# Altium footprint library Conectores GAM.PcbLib: 182 footprints (part 11 of 12)
Each footprint in its own frame and in the unit in brackets; x right, y up, seen from the top. Pads: shape width x height; smd on the part's side, far side on the other; paste and mask are expansions set on the pad; w line width, h text height; cw(c..) or ccw(c..) is an arc to the next point about the centre after c.
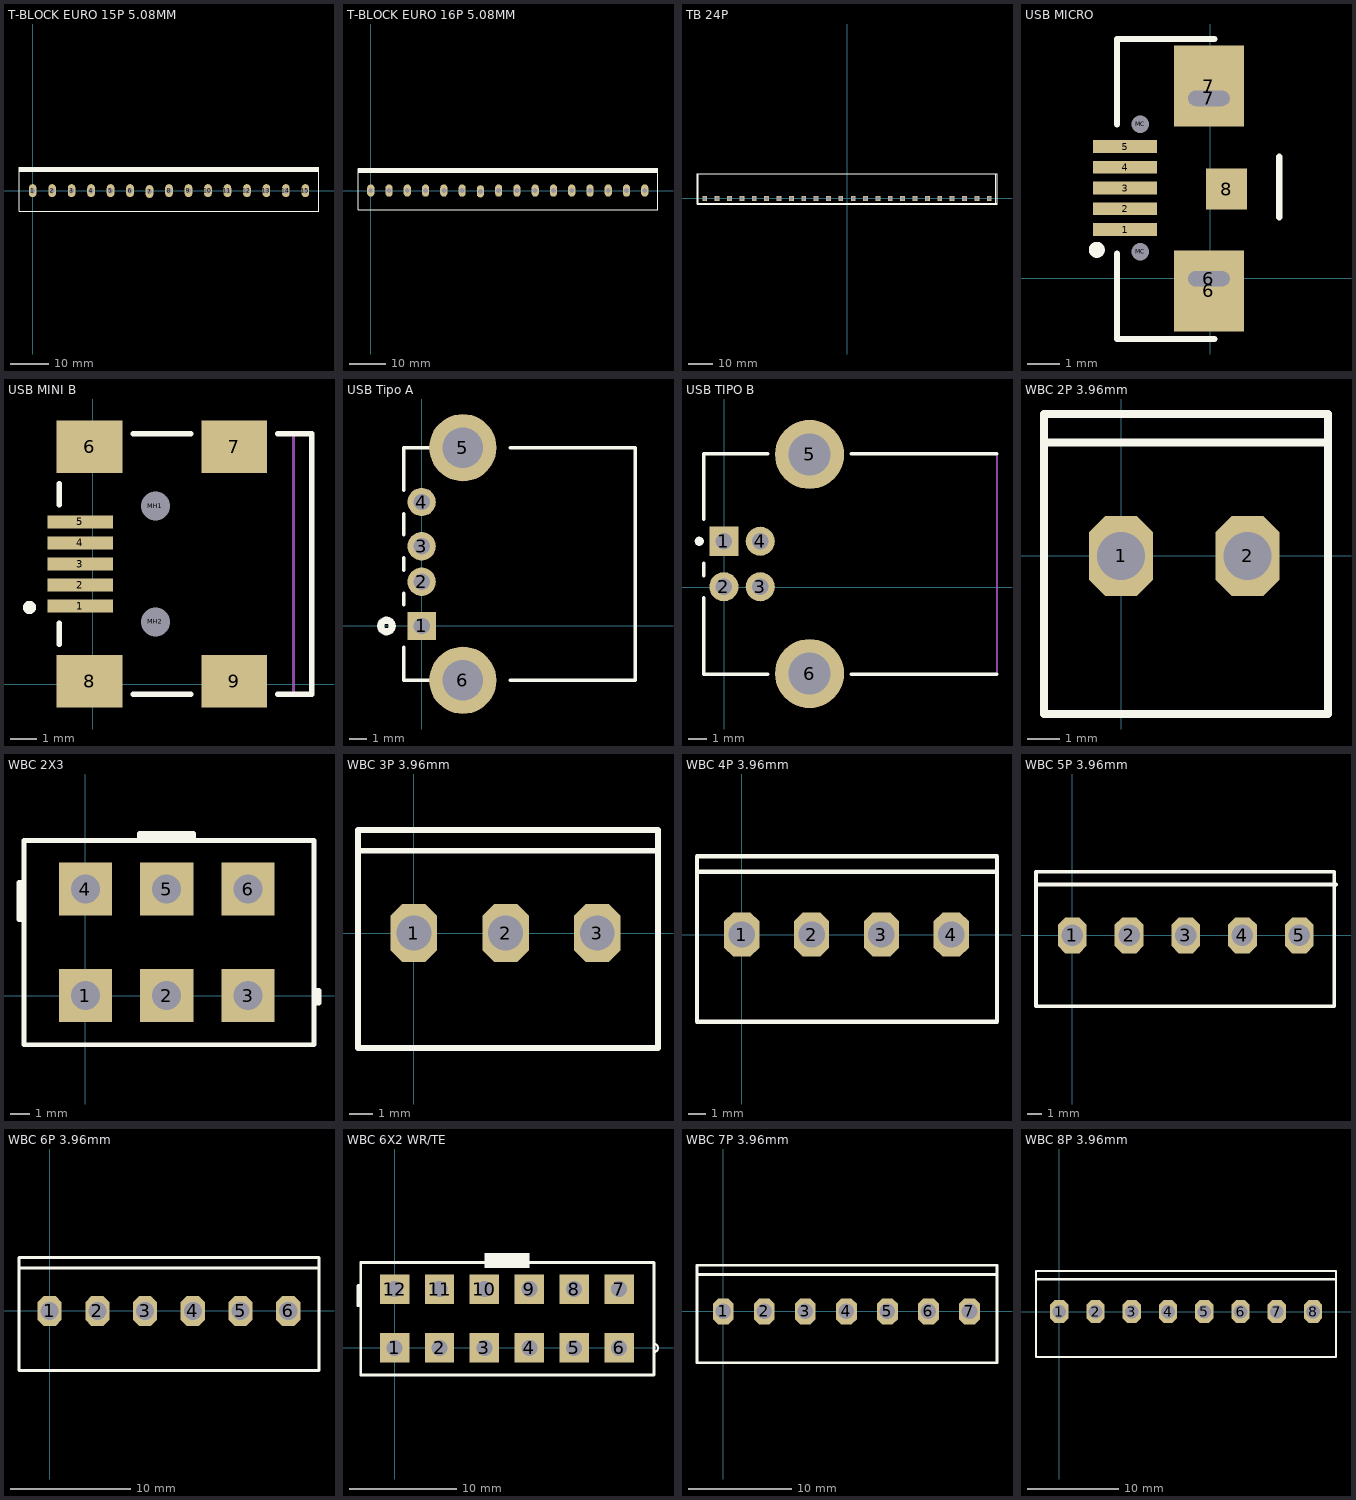
[diagram p10: the footprints below, top view; thin cyan lines are the x and y axes]

## T-BLOCK EURO 15P 5.08MM [mm] "Terminal de Bloque 15P 5.08mm EURO STYLE"
pads (15):
  oval 2x3.4 hole 1.35: 1(0,0) 2(5.08,0) 3(10.16,0) 4(15.24,0) 5(20.32,0) 6(25.4,0) 7(30.48,-0.208) 8(35.56,0) 9(40.64,0) 10(45.72,0) 11(50.8,0) 12(55.88,0) 13(60.96,0) 14(66.04,0) 15(71.12,0)
Top Overlay:
  rectangle: -3.556,4.826 74.676,6.223
  lines w0.254: -3.429,-5.334 74.549,-5.334 74.549,6.096 -3.429,6.096 -3.429,-5.334
3D body "CUI_DEVICES_TB009-508-15BE.step": height 20, standoff -3.5, extent -3.175,-5.08 74.225,5.42

## T-BLOCK EURO 16P 5.08MM [mm] "Terminal de Bloque 16P 5.08mm EURO STYLE"
pads (16):
  oval 2x3.4 hole 1.35: 1(0,0) 2(5.08,0) 3(10.16,0) 4(15.24,0) 5(20.32,0) 6(25.4,0) 7(30.48,-0.208) 8(35.56,0) 9(40.64,0) 10(45.72,0) 11(50.8,0) 12(55.88,0) 13(60.96,0) 14(66.04,0) 15(71.12,0) 16(76.2,0)
Top Overlay:
  rectangle: -3.556,4.826 79.883,6.223
  lines w0.254: -3.429,-5.334 79.756,-5.334 79.756,6.096 -3.429,6.096 -3.429,-5.334
3D body "CUI_DEVICES_TB009-508-16BE.step": height 20, standoff -3.5, extent -3.175,-5.08 79.305,5.42

## TB 24P [mm] "Desmontable Terminal Block 24P 5.08mm"
pads (24):
  rect 2x2 hole 1.5: 1(58.42,0) 2(53.34,0) 3(48.26,0) 4(43.18,0) 5(38.1,0) 6(33.02,0) 7(27.94,0) 8(22.86,0) 9(17.78,0) 10(12.7,0) 11(7.62,0) 12(2.54,0) 13(-2.54,0) 14(-7.62,0) 15(-12.7,0) 16(-17.78,0) 17(-22.86,0) 18(-27.94,0) 19(-33.02,0) 20(-38.1,0) 21(-43.18,0) 22(-48.26,0) 23(-53.34,0) 24(-58.42,0)
Top Overlay:
  lines w0.2: -61.595,-2.032 61.595,-2.032 ; -61.087,-2.413 -61.087,10.16 ; 61.087,-2.413 61.087,10.16 ; -61.595,-2.413 61.595,-2.413 61.595,10.16 -61.595,10.16 -61.595,-2.413
3D body "24PTB.stp": height 8.6, standoff -3.5, extent -60.96,-2.064 60.96,9.938

## USB MICRO [mm]
pads (12):
  rect 2x0.4 smd: 1(-2.667,1.524) 2(-2.667,2.174) 3(-2.667,2.824) 4(-2.667,3.474) 5(-2.667,4.124)
  rect 2.2x2.54 smd: 6(-0.043,-0.397) 7(-0.043,6.015)
  oval 2.15x1.1 hole 0.48 slot 1.3 at 0 deg unplated: 6(-0.043,-0.016) 7(-0.043,5.634)
  rect 1.27x1.27 smd: 8(0.508,2.794)
  round 0.3 hole 0.55 unplated: MC(-2.193,0.824) MC(-2.193,4.824)
Top Overlay:
  circle w0.25: c-3.556,0.889 r0.125
  lines w0.2: -2.921,0.762 -2.921,-1.905 0.127,-1.905 ; -2.921,4.826 -2.921,7.493 0.127,7.493 ; 2.159,1.905 2.159,3.81
3D body "Micro USB.step": height 2.65, standoff -0.69, extent -2.794,-1.068 2.696,6.715

## USB MINI B [mm]
pads (11):
  rect 2.5x0.5 smd: 1(-0.484,2.972) 2(-0.484,3.772) 3(-0.484,4.572) 4(-0.484,5.372) 5(-0.484,6.172)
  rect 2.5x2 smd: 6(-0.13,9.022) 7(5.37,9.022) 8(-0.13,0.122) 9(5.37,0.122)
  round 0.6 hole 1.1 unplated: MH1(2.37,6.772) MH2(2.37,2.372)
Top Overlay:
  circle w0.25: c-2.413,2.921 r0.125
  lines w0.2: -1.28,1.522 -1.28,2.322 ; -1.28,6.822 -1.28,7.622 ; 1.52,-0.378 3.72,-0.378 ; 1.52,9.522 3.72,9.522 ; 7.02,-0.378 8.32,-0.378 8.32,9.522 7.02,9.522
Mechanical 1:
  lines w0.1: 7.62,-0.378 7.62,9.522
  text "PCB Edge" at 8.052,0.536 h0.25
3D body "Mini USB.stp": height 4.03, standoff -0.9, extent -1.016,-0.505 8.234,9.395

## USB Tipo A [mm]
pads (6):
  rect 1.6x1.6 hole 0.92: 1(0,0)
  round 1.6 hole 0.92: 2(0,2.5) 3(0,4.5) 4(0,7)
  round 3.8 hole 2.3: 5(2.329,10.07) 6(2.329,-3.07)
Top Overlay:
  circle w0.4: c-1.985,0 r0.327
  lines w0.2: -1.01,-1.2 -1.01,-3.065 0.41,-3.065 ; -1.01,1.2 -1.01,1.84 ; -1.01,3.16 -1.01,3.84 ; -1.01,5.16 -1.01,6.34 ; -1.01,7.66 -1.01,10.065 0.41,10.065 ; 5.01,-3.065 12.065,-3.065 12.065,10.065 5.01,10.065
3D body "USB-A-01.step": height 7.95, standoff -3.2, extent -1.218,-4.527 12.482,11.273

## USB TIPO B [mm]
pads (6):
  rect 1.6x1.6 hole 0.92: 1(-0.024,2.52)
  round 1.6 hole 0.92: 2(-0.024,0.02) 3(1.976,0.02) 4(1.976,2.52)
  round 3.8 hole 2.3: 5(4.686,7.29) 6(4.686,-4.75)
Top Overlay:
  circle w0.25: c-1.374,2.52 r0.125
  lines w0.2: -1.134,-0.58 -1.134,-4.78 2.386,-4.78 ; -1.134,0.62 -1.134,1.32 ; -1.134,3.72 -1.134,7.32 2.386,7.32 ; 6.986,-4.78 14.966,-4.78 ; 6.986,7.32 14.966,7.32
Mechanical 1:
  lines w0.1: 14.986,-4.78 14.986,7.32
  text "PCB Edge" at 14.661,-4.381 h0.25
3D body "USB B.STEP": height 12, standoff -2.64, extent -1.514,-6.131 14.986,8.666

## WBC 2P 3.96mm [mm] "Wire to Board Connector 3.96mm 2P"
pads (2):
  oct 2x2.5 hole 1.5: 1(0,0) 2(3.96,0)
Top Overlay:
  lines w0.254: -2.413,3.556 6.477,3.556 ; -2.413,-4.953 6.477,-4.953 6.477,4.445 -2.413,4.445 -2.413,-4.953
3D body "JST - VH - Thru (V) - 2Pin - 3.96mm.stp": height 10.56, standoff -3.76, extent -2.245,-4.648 6.31,4.039

## WBC 2X3 [mm] "Wire to Board Connector 2x3"
pads (6):
  rect 2.75x2.75 hole 1.5: 1(0,0) 2(4.2,0) 3(8.4,0) 4(0,5.5) 5(4.2,5.5) 6(8.4,5.5)
Top Overlay:
  lines w0.254: -3.175,3.937 -3.429,3.937 -3.429,5.842 -3.175,5.842 ; 2.794,8.001 2.794,8.382 5.588,8.382 5.588,8.001 ; 2.794,8.191 5.588,8.191 ; 11.811,-0.381 12.065,-0.381 12.065,0.254 11.811,0.254 ; -3.175,-2.54 -3.175,8.001 11.811,8.001 11.811,-2.54 -3.175,-2.54
3D body "039281063.stp": height 12.8, standoff -3.5, extent -2.982,-2.286 11.618,8.714

## WBC 3P 3.96mm [mm] "Wire to Board Connector 3.96mm 3P"
pads (3):
  oct 2x2.5 hole 1.5: 1(0,0) 2(3.96,0) 3(7.92,0)
Top Overlay:
  lines w0.254: -2.413,3.556 10.541,3.556 ; -2.413,-4.953 -2.413,4.445 10.541,4.445 10.541,-4.953 -2.413,-4.953
3D body "JST - VH - Thru (V) - 3Pin - 3.96mm.stp": height 10.56, standoff -3.76, extent -2.193,-4.648 10.322,4.039

## WBC 4P 3.96mm [mm] "Wire to Board Connector 3.96mm 4P"
pads (4):
  oct 2x2.5 hole 1.5: 1(0,0) 2(3.96,0) 3(7.92,0) 4(11.88,0)
Top Overlay:
  lines w0.254: -2.413,3.556 14.478,3.556 ; -2.54,-4.953 14.478,-4.953 14.478,4.445 -2.54,4.445 -2.54,-4.953
3D body "JST - VH - Thru (V) - 4Pin - 3.96mm.stp": height 10.56, standoff -3.76, extent -2.268,-4.648 14.207,4.039

## WBC 5P 3.96mm [mm] "Wire to Board Connector 3.96mm 5P"
pads (5):
  oct 2x2.5 hole 1.5: 1(0,0) 2(3.96,0) 3(7.92,0) 4(11.88,0) 5(15.84,0)
Top Overlay:
  lines w0.254: -2.413,3.556 18.415,3.556 ; -2.54,-4.953 18.288,-4.953 18.288,4.445 -2.54,4.445 -2.54,-4.953
3D body "JST - VH - Thru (V) - 5Pin - 3.96mm.stp": height 10.56, standoff -3.76, extent -2.343,-4.648 18.092,4.039

## WBC 6P 3.96mm [mm] "Wire to Board Connector 3.96mm 6P"
pads (6):
  oct 2x2.5 hole 1.5: 1(0,0) 2(3.96,0) 3(7.92,0) 4(11.88,0) 5(15.84,0) 6(19.8,0)
Top Overlay:
  lines w0.254: -2.413,3.556 22.352,3.556 ; -2.54,-4.953 22.352,-4.953 22.352,4.445 -2.54,4.445 -2.54,-4.953
3D body "JST - VH - Thru (V) - 6Pin - 3.96mm.stp": height 10.56, standoff -3.76, extent -2.291,-4.648 22.104,4.039

## WBC 6X2 WR/TE [mm] "Wire to Board Connector 4.2mm 64901221122"
pads (12):
  rect 2.75x2.75 hole 1.5: 1(0,0) 2(4.2,0) 3(8.4,0) 4(12.6,0) 5(16.8,0) 6(21,0) 7(21,5.5) 8(16.8,5.5) 9(12.6,5.5) 10(8.4,5.5) 11(4.2,5.5) 12(0,5.5)
Top Overlay:
  rectangle: 8.4,7.493 12.6,8.89
  lines w0.2: 24.257,-0.381 ccw(c24.257,0) 24.257,0.381
  lines w0.254: -3.175,3.937 -3.429,3.937 -3.429,5.842 -3.175,5.842 ; 11.811,-0.381 12.065,-0.381 12.065,0.254 11.811,0.254 ; -3.175,-2.54 -3.175,8.001 24.257,8.001 24.257,-2.54 -3.175,-2.54
3D body "64901221122 (rev1).stp": height 13.4, standoff -2.9, extent -2.836,-2.26 23.96,8.84

## WBC 7P 3.96mm [mm] "Wire to Board Connector 3.96mm 7P"
pads (7):
  oct 2x2.5 hole 1.5: 1(0,0) 2(3.96,0) 3(7.92,0) 4(11.88,0) 5(15.84,0) 6(19.8,0) 7(23.76,0)
Top Overlay:
  lines w0.254: -2.413,3.556 26.416,3.556 ; -2.54,-4.953 26.416,-4.953 26.416,4.445 -2.54,4.445 -2.54,-4.953
3D body "JST - VH - Thru (V) - 7Pin - 3.96mm.stp": height 10.56, standoff -3.76, extent -2.239,-4.648 26.116,4.039

## WBC 8P 3.96mm [mm] "Wire to Board Connector 3.96mm 8P"
pads (8):
  oct 2x2.5 hole 1.5: 1(0,0) 2(3.96,0) 3(7.92,0) 4(11.88,0) 5(15.84,0) 6(19.8,0) 7(23.76,0) 8(27.72,0)
Top Overlay:
  lines w0.254: -2.413,3.556 30.226,3.556 ; -2.54,-4.953 -2.54,4.445 30.226,4.445 30.226,-4.953 -2.54,-4.953
3D body "JST - VH - Thru (V) - 8Pin - 3.96mm.stp": height 10.56, standoff -3.76, extent -2.314,-4.648 30.001,4.039